# Altium footprint library LUMI_Handy_Soldering_LIB.PcbLib: 562 footprints (part 33 of 36)
Each footprint in its own frame and in the unit in brackets; x right, y up, seen from the top. Pads: shape width x height; smd on the part's side, far side on the other; paste and mask are expansions set on the pad; w line width, h text height; cw(c..) or ccw(c..) is an arc to the next point about the centre after c.
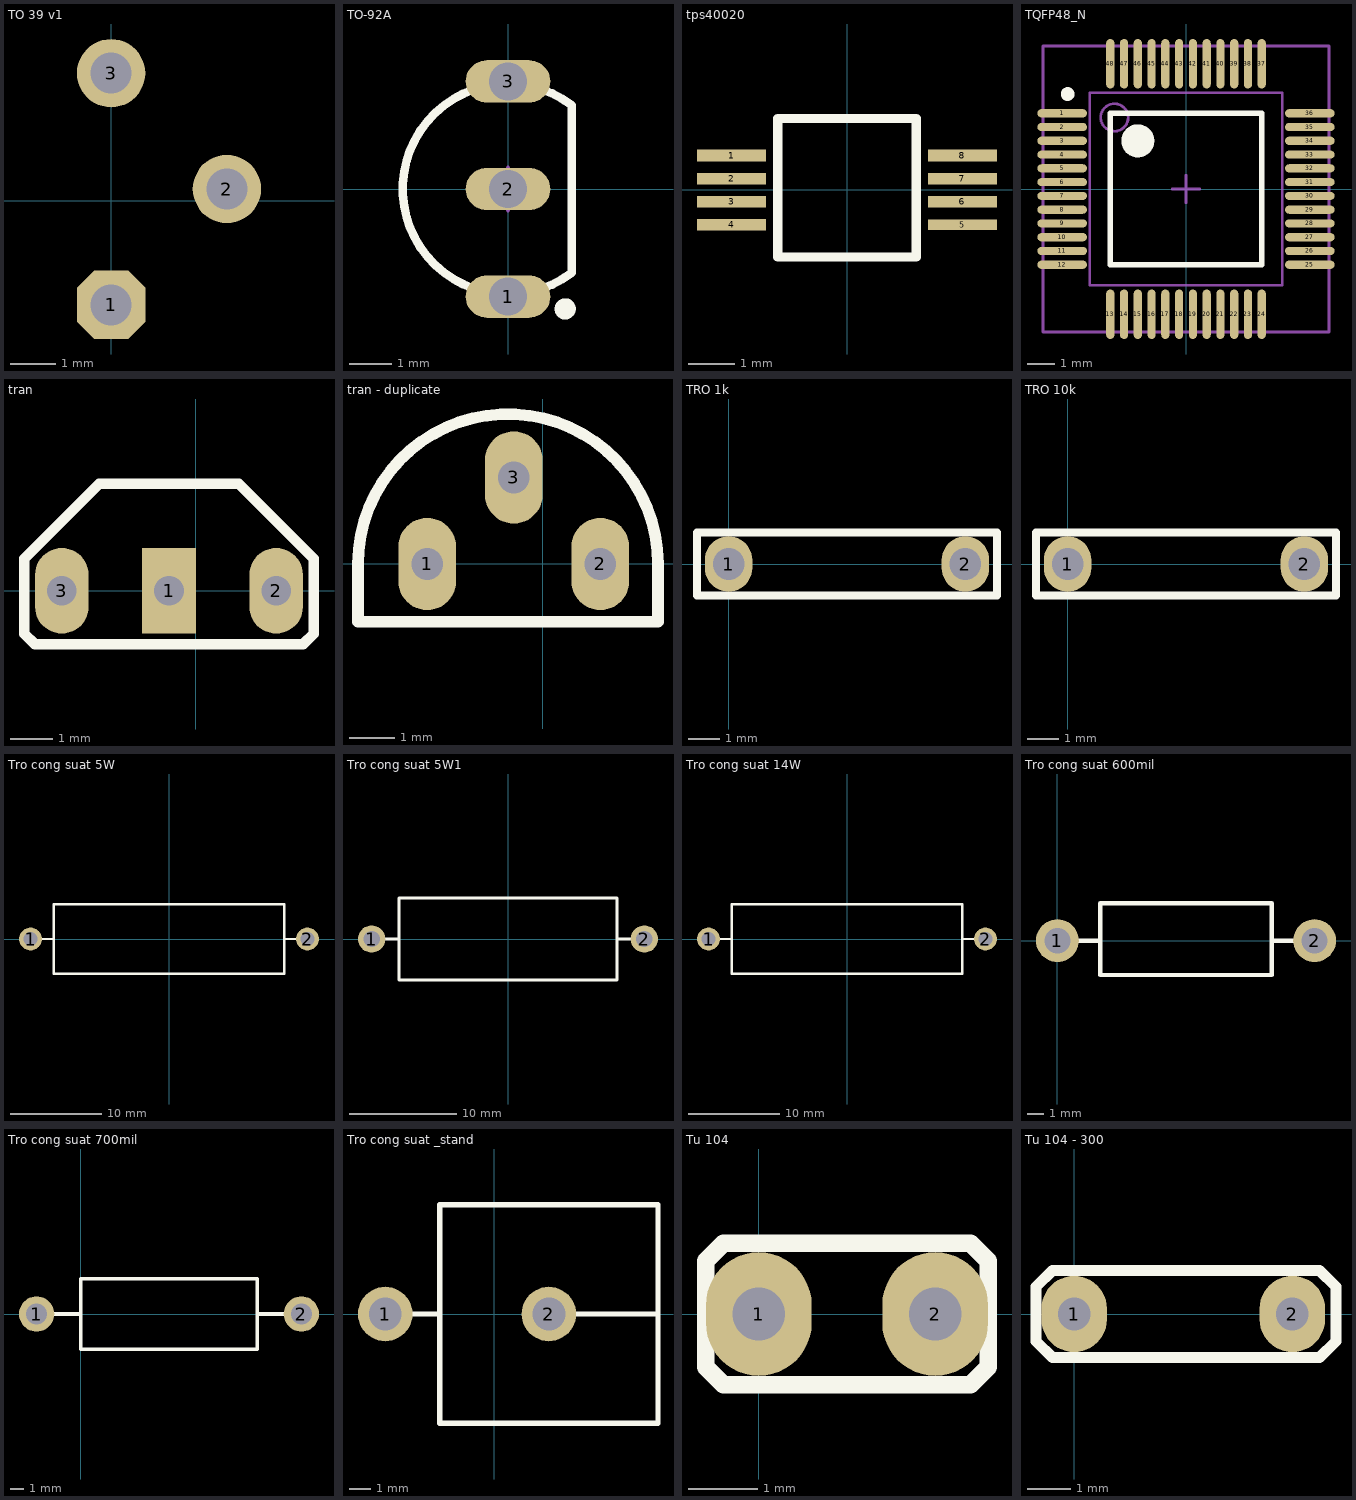
[diagram p32: the footprints below, top view; thin cyan lines are the x and y axes]

## TO 39 v1 [mm]
pads (3):
  oct 1.5x1.5 hole 0.9: 1(0,-2.286)
  round 1.5 hole 0.9: 2(2.54,0.254) 3(0,2.794)
3D body: height 5.2, standoff -3.13, extent -4.69,-4.445 4.699,4.953

## TO-92A [mm] "TO, Flat Index; 3 In-Line, Axial Leads; Body Dia. 4.5mm; Leads 0.51 x 0.48 mm (max)"
height 6.86
pads (3):
  oval 2x1 hole 0.9: 1(0,-2.54) 2(0,0) 3(0,2.54)
Top Overlay:
  circle w0.25: c1.35,-2.83 r0.125
  lines w0.2: 1.5,-1.98 cw(c0,0) 1.5,1.98 1.5,-1.98
Mechanical 13:
  lines w0.1: 1.5,-1.98 cw(c0,0) 1.5,1.98 1.5,-1.98
Mechanical 15:
  lines w0.1: -0.5,0 0.5,0 ; 0,-0.5 0,0.5
3D body: height 6.99, standoff -0.71, extent -2.371,-2.79 1.6,2.79

## tps40020 [mm]
pads (8):
  rect 1.5x0.254 smd: 1(-2.504,0.742) 2(-2.504,0.242) 3(-2.504,-0.258) 4(-2.504,-0.758) 6(2.496,-0.258) 7(2.496,0.242) 8(2.496,0.742)
  rect 1.5x0.23 smd: 5(2.496,-0.758)
Top Overlay:
  lines w0.2: -1.504,-1.458 1.496,-1.458 1.496,1.542 -1.504,1.542 -1.504,-1.458

## TQFP48_N [mm] "48-Pin Thin Quad Flat Pack 0.5 mm Pitch, IPC Medium Density"
height 1.6
pads (48):
  oval 1.8x0.3 smd: 1(-4.5,2.75) 2(-4.5,2.25) 3(-4.5,1.75) 4(-4.5,1.25) 5(-4.5,0.75) 6(-4.5,0.25) 7(-4.5,-0.25) 8(-4.5,-0.75) 9(-4.5,-1.25) 10(-4.5,-1.75) 11(-4.5,-2.25) 12(-4.5,-2.75) 25(4.5,-2.75) 26(4.5,-2.25) 27(4.5,-1.75) 28(4.5,-1.25) 29(4.5,-0.75) 30(4.5,-0.25) 31(4.5,0.25) 32(4.5,0.75) 33(4.5,1.25) 34(4.5,1.75) 35(4.5,2.25) 36(4.5,2.75)
  oval 0.3x1.8 smd: 13(-2.75,-4.55) 14(-2.25,-4.55) 15(-1.75,-4.55) 16(-1.25,-4.55) 17(-0.75,-4.55) 18(-0.25,-4.55) 19(0.25,-4.55) 20(0.75,-4.55) 21(1.25,-4.55) 22(1.75,-4.55) 23(2.25,-4.55) 24(2.75,-4.55) 37(2.75,4.55) 38(2.25,4.55) 39(1.75,4.55) 40(1.25,4.55) 41(0.75,4.55) 42(0.25,4.55) 43(-0.25,4.55) 44(-0.75,4.55) 45(-1.25,4.55) 46(-1.75,4.55) 47(-2.25,4.55) 48(-2.75,4.55)
Top Overlay:
  circle w0.25: c-4.3,3.45 r0.125
  circle w0.6: c-1.75,1.75 r0.3
  lines w0.2: -2.75,-2.75 -2.75,2.75 2.75,2.75 2.75,-2.75 -2.75,-2.75
Mechanical 13:
  circle w0.1: c-2.6,2.6 r0.5
  lines w0.1: -3.5,-3.5 -3.5,3.5 3.5,3.5 3.5,-3.5 -3.5,-3.5
Mechanical 15:
  lines w0.1: -0.5,0 0.5,0 ; 0,-0.5 0,0.5 ; -5.2,-5.2 -5.2,5.2 5.2,5.2 5.2,-5.2 -5.2,-5.2
3D body: height 1.6, standoff 0, extent -3.5,-3.5 3.5,3.5
3D body: height 1.5, standoff 0, extent -4.5,-4.5 4.5,4.5

## tran [mm]
pads (3):
  rect 1.27x2.032 hole 0.7: 1(-0.635,0)
  oval 1.27x2.032 hole 0.7: 2(1.905,0) 3(-3.175,0)
Top Overlay:
  lines w0.254: -4.064,-1.016 -3.81,-1.27 2.54,-1.27 2.794,-1.016 2.794,0.762 1.016,2.54 -2.286,2.54 -4.064,0.762 -4.064,-1.016
3D body: height 6.99, standoff -0.71, extent -3.425,-1.6 2.155,2.371

## tran - duplicate [mm]
pads (3):
  oval 1.27x2.032 hole 0.7: 1(-2.54,0) 2(1.27,0) 3(-0.635,1.905)
Top Overlay:
  lines w0.254: -4.064,-1.27 2.54,-1.27 2.54,0 ccw(c-0.762,0) -4.064,0 -4.064,-1.27
3D body: height 6.99, standoff -0.71, extent -3.39,-1.1 2.19,2.871

## TRO 1k [mil]
pads (2):
  oval 60x70 hole 40: 1(0,0) 2(300,0)
Top Overlay:
  lines w10: -40,-40 340,-40 340,40 -40,40 -40,-40

## TRO 10k [mil]
pads (2):
  oval 60x70 hole 40: 1(0,0) 2(300,0)
Top Overlay:
  lines w10: -40,-40 -40,40 340,40 340,-40 -40,-40
3D body: height 85.43, standoff -146.85, extent -11.53,-35.43 303.43,35.43

## Tro cong suat 5W [mil]
pads (2):
  round 100 hole 60: 1(-600,0) 2(600,0)
Top Overlay:
  lines w10: -600,0 -500,0 ; 500,0 600,0 ; -500,-150 -500,150 500,150 500,-150 -500,-150
3D body: height 321.26, standoff -119.69, extent -607.87,-137.79 623.63,137.8

## Tro cong suat 5W1 [mil]
pads (2):
  round 100 hole 60: 1(-500,0) 2(500,0)
Top Overlay:
  lines w10: -500,0 -400,0 ; 400,0 450,0 ; -400,-150 -400,150 400,150 400,-150 -400,-150
3D body: height 362.6, standoff -98.43, extent -519.69,-190.95 519.68,190.94

## Tro cong suat 14W [mil]
pads (2):
  round 100 hole 60: 1(-600,0) 2(600,0)
Top Overlay:
  lines w10: -600,0 -500,0 ; 500,0 600,0 ; -500,-150 -500,150 500,150 500,-150 -500,-150

## Tro cong suat 600mil [mil]
pads (2):
  round 100 hole 60: 1(0,0) 2(600,0)
Top Overlay:
  lines w10: 0,0 100,0 ; 500,0 600,0 ; 100,-80 100,87.5 500,87.5 500,-37.5 500,-80 200,-80 100,-80
3D body: height 182.68, standoff -100.79, extent -21.77,-77 631.77,88.36

## Tro cong suat 700mil [mil]
pads (2):
  round 100 hole 60: 1(-125,0) 2(625,0)
Top Overlay:
  lines w10: -125,0 0,0 ; 500,0 625,0 ; 0,-100 0,100 137.5,100 362.5,100 500,100 500,-37.5 500,-100 220,-100 0,-100
3D body: height 198.43, standoff -85.04, extent -159.45,-98.42 659.45,98.43

## Tro cong suat _stand [mil]
pads (2):
  round 100 hole 60: 1(-200,0) 2(100,0)
Top Overlay:
  lines w10: -200,0 -100,0 ; 100,0 300,0 ; -100,-200 -100,200 300,200 300,-200 -100,-200
3D body: height 917.48, standoff -84.49, extent -207.48,-200 307.48,193.7

## Tu 104 [mil]
pads (2):
  oval 60x70 hole 30: 1(0,0) 2(100,0)
Top Overlay:
  lines w10: -30,-30 -30,30 -20,40 120,40 130,30 130,-30 120,-40 -20,-40 -30,-30
3D body: height 200, standoff 30, extent -40,-40 140,40
3D body: height 50, standoff -50, extent -9.91,-9.97 10.01,9.99
3D body: height 50, standoff -50, extent 90.09,-9.97 110.01,9.99

## Tu 104 - 300 [mil]
pads (2):
  oval 60x70 hole 30: 1(0,0) 2(200,0)
Top Overlay:
  lines w10: -35,-25 -35,25 -20,40 120,40 225,40 240,25 240,-25 225,-40 -20,-40 -35,-25
3D body: height 200, standoff 30, extent -35,-40 240,40
3D body: height 50, standoff -50, extent -9.91,-9.97 10.01,9.99
3D body: height 50, standoff -50, extent 190.09,-9.97 210.01,9.99